# Altium footprint library 20210518.PcbLib: 414 footprints (part 23 of 26)
Each footprint in its own frame and in the unit in brackets; x right, y up, seen from the top. Pads: shape width x height; smd on the part's side, far side on the other; paste and mask are expansions set on the pad; w line width, h text height; cw(c..) or ccw(c..) is an arc to the next point about the centre after c.
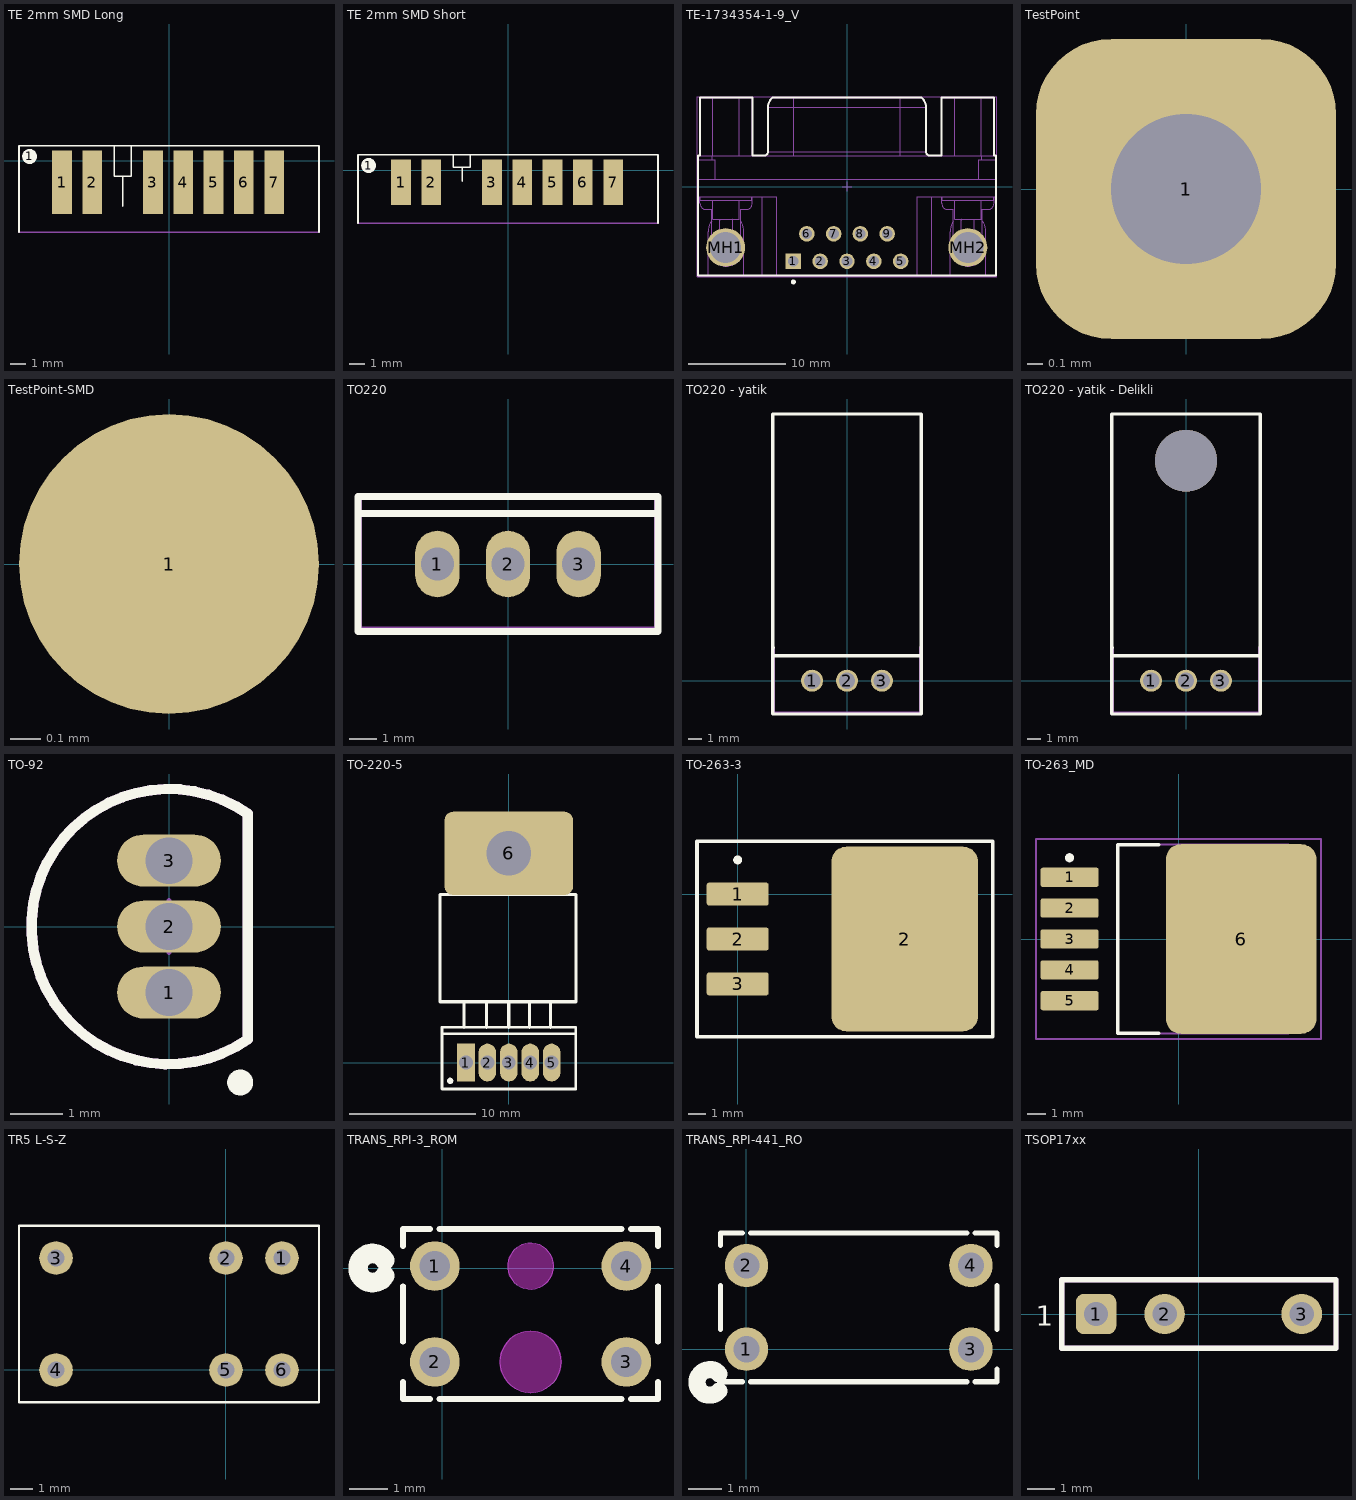
[diagram p22: the footprints below, top view; thin cyan lines are the x and y axes]

## TE 2mm SMD Long [mm] "2mm pitch Battery Rec. Assy. 7Pos. H=4.0"
pads (8):
  round 1 on Top Overlay: 1(-9.2,0.3)
  rect 1.3x4.2 smd: 1(-7.06,-1.4) 2(-5.06,-1.4) 3(-1.06,-1.4) 4(0.94,-1.4) 5(2.94,-1.4) 6(4.94,-1.4) 7(6.94,-1.4)
Top Overlay:
  lines w0.1: -9.9,-4.7 -9.9,1 9.9,1 9.9,-4.7 ; -3.6,1 -3.6,-1 -2.5,-1 -2.5,1 ; -3.06,-3 -3.06,-1
Mechanical 15:
  lines w0.1: -9.9,-4.7 9.9,-4.7
3D body: height 3.3, standoff -0.7, extent -9.4,-10.71 9.4,-0.01

## TE 2mm SMD Short [mm] "2mm pitch Battery Rec. Assy. 7Pos. H=4.0"
pads (8):
  round 1 on Top Overlay: 1(-9.2,0.3)
  rect 1.3x3 smd: 1(-7.06,-0.8) 2(-5.06,-0.8) 3(-1.06,-0.8) 4(0.94,-0.8) 5(2.94,-0.8) 6(4.94,-0.8) 7(6.94,-0.8)
Top Overlay:
  lines w0.1: -9.9,-3.5 -9.9,1 9.9,1 9.9,-3.5 ; -3.6,1 -3.6,0.18 -2.5,0.18 -2.5,1 ; -3.02,-0.73 -3.02,0.18
Mechanical 15:
  lines w0.1: -9.9,-3.5 9.9,-3.5
3D body: height 3.2, standoff -0.8, extent -9.5,-9.1 9.3,0.2

## TE-1734354-1-9_V [mm] "TH, 9-Leads, Body 30.8x18.4mm, Pitch 2.77mm"
height 12.75
pads (11):
  rect 1.6x1.6 hole 1.09: 1(-5.54,-7.72)
  round 1.6 hole 1.09: 2(-2.77,-7.72) 3(0,-7.72) 4(2.77,-7.72) 5(5.54,-7.72) 6(-4.155,-4.88) 7(-1.385,-4.88) 8(1.385,-4.88) 9(4.155,-4.88)
  round 4 hole 3.2: MH1(-12.545,-6.3) MH2(12.495,-6.3)
Top Overlay:
  circle w0.25: c-5.54,-9.85 r0.125
  lines w0.2: -15.4,-9.2 15.4,-9.2 15.4,3.2 15.209,3.2 15.209,9.2 9.781,9.2 9.781,3.2 8.565,3.2 cw(c8.565,3.6) 8.165,3.6 8.165,8.2 ccw(c6.895,8.2) 7.678,9.2 -7.678,9.2 ccw(c-6.895,8.2) -8.165,8.2 -8.165,3.6 cw(c-8.565,3.6) -8.565,3.2 -9.781,3.2 -9.781,9.2 -15.209,9.2 -15.209,3.2 -15.4,3.2 -15.4,-9.2
Mechanical 13:
  lines w0.1: -15.4,-1.05 -7.25,-1.05 -7.25,-9.2 ; -15.4,0.75 15.4,0.75 ; -15.4,2.77 -13.9,2.77 ; -15.209,3.2 -15.209,9.2 -9.781,9.2 -9.781,3.2 ; -15.195,-1.05 -15.195,-1.75 ccw(c-14.595,-1.75) -14.595,-2.35 -13.995,-2.35 -13.995,-5.495 ; -15.145,-1.05 -15.145,-1.4 -9.845,-1.4 -9.845,-1.05 ; -14.345,-9.2 -14.345,-4.65 cw(c-12.495,-4.65) -13.995,-3.567 ; -14.345,-6.38 ccw(c-12.495,-6.38) -10.645,-6.38 ; -14.345,-5.995 -14.104,-5.995 ; -14.331,-6.605 -14.104,-6.605 ; -13.995,-5.995 -14.104,-5.995 ; -13.9,3.2 -13.9,2.77 ; -13.855,-1.4 -13.855,-3.4 -11.135,-3.4 -11.135,-1.4 ; -13.852,3.2 -13.852,9.2 ; -13.6,0.75 -13.6,2.77 -13.9,2.77 ; -13.157,-3.4 ccw(c-12.495,-3.465) -13.16,-3.465 -13.16,-5.495 ; -11.833,-3.4 cw(c-12.495,-3.465) -11.83,-3.465 -11.83,-5.495 ; -11.138,3.2 -11.138,9.2 ; -10.995,-5.995 -10.886,-5.995 ; -10.995,-3.567 cw(c-12.495,-4.65) -10.645,-4.65 -10.645,-9.2 ; -10.659,-6.605 -10.886,-6.605 ; -10.645,-5.995 -10.886,-5.995 ; -9.795,-1.05 -9.795,-1.75 cw(c-10.395,-1.75) -10.395,-2.35 -10.995,-2.35 -10.995,-5.495 ; -8.75,-9.2 -8.75,-1.05 ; -8.565,3.2 ccw(c-8.565,3.6) -8.165,3.6 ; -5.525,3.2 -5.525,3.6 ; -5.525,9.2 -5.525,8.2 ; 5.525,3.2 5.525,3.6 ; 5.525,9.2 5.525,8.2 ; 7.25,-9.2 7.25,-1.05 15.4,-1.05 ; 8.565,3.2 cw(c8.565,3.6) 8.165,3.6 ; 8.75,-9.2 8.75,-1.05 ; 9.781,3.2 9.781,9.2 15.209,9.2 15.209,3.2 ; 9.795,-1.05 9.795,-1.75 ccw(c10.395,-1.75) 10.395,-2.35 10.995,-2.35 10.995,-5.495 ; 9.845,-1.05 9.845,-1.4 15.145,-1.4 15.145,-1.05 ; 10.645,-9.2 10.645,-4.65 cw(c12.495,-4.65) 10.995,-3.567 ; 10.645,-6.38 ccw(c12.495,-6.38) 14.345,-6.38 ; 10.645,-5.995 10.886,-5.995 ; 10.659,-6.605 10.886,-6.605 ; 10.995,-5.995 10.886,-5.995 ; 11.135,-1.4 11.135,-3.4 13.855,-3.4 13.855,-1.4 ; 11.138,3.2 11.138,9.2 ; 11.833,-3.4 ccw(c12.495,-3.465) 11.83,-3.465 11.83,-5.495 ; 13.157,-3.4 cw(c12.495,-3.465) 13.16,-3.465 13.16,-5.495 ; 13.6,0.75 13.6,2.77 13.9,2.77 ; 13.852,3.2 13.852,9.2 ; 13.9,3.2 13.9,2.77 ; 13.995,-5.995 14.104,-5.995 ; 13.995,-3.567 cw(c12.495,-4.65) 14.345,-4.65 14.345,-9.2 ; 14.331,-6.605 14.104,-6.605 ; 14.345,-5.995 14.104,-5.995 ; 15.195,-1.05 15.195,-1.75 cw(c14.595,-1.75) 14.595,-2.35 13.995,-2.35 13.995,-5.495 ; 15.4,2.77 13.9,2.77 ; -14.104,-6.605 -13.995,-6.605 ; -14.104,-6.605 -14.104,-5.995 ; -13.995,-6.605 -13.16,-6.605 -13.16,-5.495 ; -13.995,-6.605 -13.995,-5.495 ; -13.995,-5.495 -13.16,-5.495 ; -11.83,-5.495 -10.995,-5.495 ; -11.83,-5.495 -11.83,-6.605 -10.995,-6.605 ; -10.995,-6.605 -10.995,-5.495 ; -10.995,-6.605 -10.886,-6.605 ; -10.886,-6.605 -10.886,-5.995 ; -8.165,3.6 -5.525,3.6 ; -8.165,3.6 -8.165,8.2 ; -8.165,8.2 cw(c-6.895,8.2) -7.678,9.2 7.678,9.2 cw(c6.895,8.2) 8.165,8.2 ; -8.165,8.2 -5.525,8.2 ; -5.525,3.6 -5.525,8.2 ; -5.525,3.6 5.525,3.6 ; -5.525,8.2 5.525,8.2 ; 5.525,3.6 5.525,8.2 ; 5.525,3.6 8.165,3.6 ; 5.525,8.2 8.165,8.2 ; 8.165,3.6 8.165,8.2 ; 10.886,-6.605 10.995,-6.605 ; 10.886,-6.605 10.886,-5.995 ; 10.995,-6.605 11.83,-6.605 11.83,-5.495 ; 10.995,-6.605 10.995,-5.495 ; 10.995,-5.495 11.83,-5.495 ; 13.16,-5.495 13.16,-6.605 13.995,-6.605 ; 13.16,-5.495 13.995,-5.495 ; 13.995,-6.605 14.104,-6.605 ; 13.995,-6.605 13.995,-5.495 ; 14.104,-6.605 14.104,-5.995 ; -15.4,-9.2 15.4,-9.2 15.4,3.2 -15.4,3.2 -15.4,-9.2
Mechanical 15:
  lines w0.05: -15.5,-9.3 15.5,-9.3 15.5,9.3 -15.5,9.3 -15.5,-9.3
  lines w0.1: -0.5,0 0.5,0 ; 0,-0.5 0,0.5
3D body: height 12.5, standoff -4.1, extent -15.4,-9.2 15.4,9.22

## TestPoint [mm] "Custom Test Point"
pads (1):
  rrect50% 2x2 hole 1: 1(0,0)

## TestPoint-SMD [mm] "Custom Test Point"
pads (1):
  round 1 smd: 1(0,0)

## TO220 [mm]
pads (3):
  oval 1.6x2.4 hole 1.2: 1(-2.54,0) 2(0,0) 3(2.54,0)
Top Overlay:
  lines w0.254: -5.375,1.825 5.375,1.825 ; -5.375,2.4 -5.35,2.4 ; -5.4,-2.425 5.4,-2.425 5.4,2.425 -5.4,2.425 -5.4,-2.425
Mechanical 15:
  lines w0.254: -5.375,2.425 -5.375,-2.375 5.375,-2.375 5.375,2.4
3D body: height 20.8, standoff -7.98, extent -5.05,-2.2 4.85,2.3

## TO220 - yatik [mm]
pads (3):
  round 1.6 hole 1.2: 1(-2.54,0) 2(0,0) 3(2.54,0)
Top Overlay:
  lines w0.254: -5.375,1.825 5.375,1.825 ; -5.375,2.4 -5.35,2.4 ; -5.4,-2.425 -5.4,19.4 5.4,19.4 5.4,-2.425 -5.4,-2.425
Mechanical 15:
  lines w0.254: -5.375,2.425 -5.375,-2.375 5.375,-2.375 5.375,2.4
3D body: height 4.45, standoff -1.79, extent -4.96,-0.14 5.2,19.14

## TO220 - yatik - Delikli [mm]
pads (3):
  round 1.6 hole 1.2: 1(-2.54,0) 2(0,0) 3(2.54,0)
via 0,16 diameter 4.5 hole 4.5
Top Overlay:
  lines w0.254: -5.375,1.825 5.375,1.825 ; -5.375,2.4 -5.35,2.4 ; -5.4,-2.425 5.4,-2.425 5.4,19.4 -5.4,19.4 -5.4,-2.425
Mechanical 15:
  lines w0.254: -5.375,2.425 -5.375,-2.375 5.375,-2.375 5.375,2.4
3D body: height 4.45, standoff -1.79, extent -4.96,-0.14 5.2,19.14

## TO-92 [mm] "TO-92; 3 In-Line, Axial Leads; Body Dia. 4.8mm; Leads 0.55 x 0.51 mm (max)"
height 5.33
pads (3):
  oval 2x1 hole 0.9: 1(0,-1.27) 2(0,0) 3(0,1.27)
Top Overlay:
  circle w0.25: c1.371,-3.003 r0.125
  lines w0.2: 1.52,-2.171 cw(c0,0) 1.52,2.171 1.52,-2.171
Mechanical 13:
  lines w0.2: 1.52,-2.171 cw(c0,0) 1.52,2.171 1.52,-2.171
Mechanical 15:
  lines w0.1: -0.5,0 0.5,0 ; 0,-0.5 0,0.5
3D body: height 10.55, standoff -3.65, extent -2.3,-2.4 1.7,2.4

## TO-220-5 [mm] "TO220-5, Thru-Hole, Horizontal, PCB HeatSink; 5 In-Line Leads; Pitch 1.70 mm"
height 5.6
pads (6):
  rect 1.4x3 hole 1.1: 1(-3.4,0)
  oval 1.4x3 hole 1.1: 2(-1.7,0) 3(0,0) 4(1.7,0) 5(3.4,0)
  rrect20% 10.2x6.6 hole 3.5: 6(0,16.6)
Top Overlay:
  circle w0.25: c-4.65,-1.45 r0.125
  lines w0.2: -5.3,2.3 5.3,2.3 ; -5.3,-2.1 -5.3,2.8 5.3,2.8 5.3,-2.1 -5.3,-2.1
  lines w0.254: -3.556,2.794 -3.556,4.826 ; -1.778,2.794 -1.778,4.826 ; 0,2.794 0,4.826 ; 1.651,2.794 1.651,4.826 ; 3.302,2.794 3.302,4.826 ; -5.461,4.826 5.334,4.826 5.334,13.335 -5.461,13.335 -5.461,4.826
Mechanical 13:
  lines w0.1: -5.3,2.3 5.3,2.3 ; -5.3,-2.1 5.3,-2.1 5.3,2.8 -5.3,2.8 -5.3,-2.1 ; -3.91,-0.28 -2.89,-0.28 -2.89,0.28 -3.91,0.28 -3.91,-0.28 ; -2.21,-0.28 -1.19,-0.28 -1.19,0.28 -2.21,0.28 -2.21,-0.28 ; -0.51,-0.28 0.51,-0.28 0.51,0.28 -0.51,0.28 -0.51,-0.28 ; 1.19,-0.28 2.21,-0.28 2.21,0.28 1.19,0.28 1.19,-0.28 ; 2.89,-0.28 3.91,-0.28 3.91,0.28 2.89,0.28 2.89,-0.28
Mechanical 15:
  lines w0.1: -0.5,0 0.5,0 ; 0,-0.5 0,0.5
3D body: height 4.56, standoff -5.94, extent -5.081,-0.3 5.081,19.868

## TO-263-3 [mm] "10.16 mm × 9.01 mm"
height 4.83
pads (4):
  rrect20% 3.5x1.3 smd: 1(0,0) 2(0,-2.54) 3(0,-5.08)
  rrect20% 8.3x10.45 smd: 2(9.45,-2.54)
Top Overlay:
  circle w0.25: c0,1.935 r0.125
  lines w0.2: -2.3,-8.08 14.43,-8.08 14.43,3 -2.3,3 -2.3,-8.08
Mechanical 15:
  lines w0.1: 5.5,-2.54 6.5,-2.54 ; 6,-3.04 6,-2.04
3D body: height 4.88, standoff 0.08, extent -1.675,-7.54 13.995,2.46

## TO-263_MD [mm] "D2-PAK, 6-Leads, Body 8.6x10.2mm, Pitch 1.7mm, Lead Span 14.1mm, IPC Medium Density"
height 4.65
pads (6):
  rrect20% 3.2x1.05 smd: 1(-6,3.4) 2(-6,1.7) 3(-6,0) 4(-6,-1.7) 5(-6,-3.4)
  rrect20% 8.3x10.45 smd: 6(3.45,0)
Top Overlay:
  circle w0.25: c-6,4.475 r0.125
  lines w0.2: -1.1,-5.2 -3.35,-5.2 -3.35,5.2 -1.1,5.2
Mechanical 13:
  lines w0.1: -3.35,-5.2 6.05,-5.2 6.05,5.2 -3.35,5.2 -3.35,-5.2
Mechanical 15:
  lines w0.1: -0.5,0 0.5,0 ; 0,-0.5 0,0.5 ; -7.85,-5.5 7.85,-5.5 7.85,5.5 -7.85,5.5 -7.85,-5.5
3D body: height 4.56, standoff 0, extent -6.902,-5.08 7.113,5.08

## TR5 L-S-Z [mil] "Relay"
pads (6):
  round 60 hole 30: 1(100,200) 2(0,200) 3(-303.54,200) 4(-303.54,0) 5(0,0) 6(100,0)
Top Overlay:
  lines w3.94: -369.69,-57.48 166.14,-57.48 166.14,257.48 -369.69,257.48 -369.69,-57.48

## TRANS_RPI-3_ROM [mil]
pads (4):
  round 51 hole 31 mask-1000: 1(-7.87,1.97) 2(-7.87,-96.46) 3(188.98,-96.46) 4(188.98,1.97)
Top Overlay:
  lines w6: -40.45,-117.17 -40.45,-134.74 -12.78,-134.74 ; -40.45,-75.75 -40.45,-18.74 ; -40.45,22.68 -40.45,40.26 -12.78,40.26 ; -2.97,-134.74 184.07,-134.74 ; -2.97,40.26 184.07,40.26 ; 193.88,-134.74 221.55,-134.74 221.55,-117.17 ; 193.88,40.26 221.55,40.26 221.55,22.68 ; 221.55,-75.75 221.55,-18.74
  lines w20: -59.17,-8.01 cw(c-71.85,0) -59.17,8.01
Bottom Overlay:
  circle w20: c-71.85,0 r15
Top Solder:
  region: 188.98,-122.46 198.93,-120.48 207.36,-114.84 213,-106.41 214.98,-96.46 213,-86.51 207.36,-78.07 198.93,-72.44 188.98,-70.46 179.03,-72.44 170.59,-78.07 164.96,-86.51 162.98,-96.46 164.96,-106.41 170.59,-114.84 179.03,-120.48
  region: 188.98,-24.03 198.93,-22.05 207.36,-16.42 213,-7.98 214.98,1.97 213,11.92 207.36,20.35 198.93,25.99 188.98,27.97 179.03,25.99 170.59,20.35 164.96,11.92 162.98,1.97 164.96,-7.98 170.59,-16.42 179.03,-22.05
  region: -7.87,-122.46 2.08,-120.48 10.51,-114.84 16.15,-106.41 18.13,-96.46 16.15,-86.51 10.51,-78.07 2.08,-72.44 -7.87,-70.46 -17.82,-72.44 -26.26,-78.07 -31.89,-86.51 -33.87,-96.46 -31.89,-106.41 -26.26,-114.84 -17.82,-120.48
  region: -7.87,-24.03 2.08,-22.05 10.51,-16.42 16.15,-7.98 18.13,1.97 16.15,11.92 10.51,20.35 2.08,25.99 -7.87,27.97 -17.82,25.99 -26.26,20.35 -31.89,11.92 -33.87,1.97 -31.89,-7.98 -26.26,-16.42 -17.82,-22.05
Bottom Solder:
  region: 188.98,-122.46 198.93,-120.48 207.36,-114.84 213,-106.41 214.98,-96.46 213,-86.51 207.36,-78.07 198.93,-72.44 188.98,-70.46 179.03,-72.44 170.59,-78.07 164.96,-86.51 162.98,-96.46 164.96,-106.41 170.59,-114.84 179.03,-120.48
  region: 188.98,-24.03 198.93,-22.05 207.36,-16.42 213,-7.98 214.98,1.97 213,11.92 207.36,20.35 198.93,25.99 188.98,27.97 179.03,25.99 170.59,20.35 164.96,11.92 162.98,1.97 164.96,-7.98 170.59,-16.42 179.03,-22.05
  region: -7.87,-122.46 2.08,-120.48 10.51,-114.84 16.15,-106.41 18.13,-96.46 16.15,-86.51 10.51,-78.07 2.08,-72.44 -7.87,-70.46 -17.82,-72.44 -26.26,-78.07 -31.89,-86.51 -33.87,-96.46 -31.89,-106.41 -26.26,-114.84 -17.82,-120.48
  region: -7.87,-24.03 2.08,-22.05 10.51,-16.42 16.15,-7.98 18.13,1.97 16.15,11.92 10.51,20.35 2.08,25.99 -7.87,27.97 -17.82,25.99 -26.26,20.35 -31.89,11.92 -33.87,1.97 -31.89,-7.98 -26.26,-16.42 -17.82,-22.05
Keep-Out Layer:
  board cut-out: 118.06,-112.34 119.1,-110.53 121.49,-104.75 122.59,-96.46 121.49,-88.17 118.29,-80.44 113.2,-73.8 106.57,-68.71 98.84,-65.51 90.55,-64.42 82.26,-65.51 74.53,-68.71 67.9,-73.8 62.81,-80.44 59.61,-88.17 58.79,-94.37 58.79,-96.46 58.79,-98.54 59.61,-104.75 62.81,-112.47 67.9,-119.11 74.53,-124.2 82.26,-127.4 90.55,-128.49 98.84,-127.4 106.57,-124.2 115.97,-115.96
  board cut-out: 114.17,1.97 114.17,4.3 112.8,11.19 107.58,19 99.77,24.22 92.88,25.59 90.55,25.59 88.22,25.59 81.33,24.22 73.52,19 68.3,11.19 66.93,4.3 66.93,1.97 66.93,-0.36 68.3,-7.25 73.52,-15.06 81.33,-20.28 88.22,-21.65 90.55,-21.65 92.88,-21.65 99.77,-20.28 107.58,-15.06 112.8,-7.25 114.17,-0.36
Outline:
  circle w0.5: c90.55,1.97 r23.62
  lines w0.5: 117.83,-112.2 ccw(c90.55,-96.46) 117.83,-112.2
3D body: height 212.6, standoff -78.74, extent -36.42,-129.92 217.52,35.43

## TRANS_RPI-441_RO [mil]
pads (4):
  round 51 hole 31 mask-1000: 1(0,0) 2(0,98.43) 3(263.78,0) 4(263.78,98.43)
Top Overlay:
  lines w6: -30.61,-23.52 -30.61,-38.29 -4.9,-38.29 ; -30.61,23.52 -30.61,74.91 ; -30.61,121.94 -30.61,136.71 -4.9,136.71 ; 4.9,-38.29 258.88,-38.29 ; 4.9,136.71 258.88,136.71 ; 268.68,-38.29 294.39,-38.29 294.39,-23.52 ; 268.68,136.71 294.39,136.71 294.39,121.94 ; 294.39,23.52 294.39,74.91
  lines w20: -32,-49 cw(c-43.13,-38.95) -32,-28.89
Bottom Overlay:
  circle w20: c-43.13,-38.95 r15
Top Solder:
  region: 263.78,124.42 253.83,122.45 245.4,116.81 239.76,108.37 237.78,98.43 239.76,88.48 245.4,80.04 253.83,74.4 263.78,72.43 273.73,74.4 282.16,80.04 287.8,88.48 289.78,98.43 287.8,108.37 282.16,116.81 273.73,122.45
  region: 263.78,26 253.83,24.02 245.4,18.38 239.76,9.95 237.78,0 239.76,-9.95 245.4,-18.38 253.83,-24.02 263.78,-26 273.73,-24.02 282.16,-18.38 287.8,-9.95 289.78,0 287.8,9.95 282.16,18.38 273.73,24.02
  region: 0,124.42 -9.95,122.45 -18.38,116.81 -24.02,108.37 -26,98.43 -24.02,88.48 -18.38,80.04 -9.95,74.4 0,72.43 9.95,74.4 18.38,80.04 24.02,88.48 26,98.43 24.02,108.37 18.38,116.81 9.95,122.45
  region: 0,26 -9.95,24.02 -18.38,18.38 -24.02,9.95 -26,0 -24.02,-9.95 -18.38,-18.38 -9.95,-24.02 0,-26 9.95,-24.02 18.38,-18.38 24.02,-9.95 26,0 24.02,9.95 18.38,18.38 9.95,24.02
Bottom Solder:
  region: 263.78,124.42 253.83,122.45 245.4,116.81 239.76,108.37 237.78,98.43 239.76,88.48 245.4,80.04 253.83,74.4 263.78,72.43 273.73,74.4 282.16,80.04 287.8,88.48 289.78,98.43 287.8,108.37 282.16,116.81 273.73,122.45
  region: 263.78,26 253.83,24.02 245.4,18.38 239.76,9.95 237.78,0 239.76,-9.95 245.4,-18.38 253.83,-24.02 263.78,-26 273.73,-24.02 282.16,-18.38 287.8,-9.95 289.78,0 287.8,9.95 282.16,18.38 273.73,24.02
  region: 0,124.42 -9.95,122.45 -18.38,116.81 -24.02,108.37 -26,98.43 -24.02,88.48 -18.38,80.04 -9.95,74.4 0,72.43 9.95,74.4 18.38,80.04 24.02,88.48 26,98.43 24.02,108.37 18.38,116.81 9.95,122.45
  region: 0,26 -9.95,24.02 -18.38,18.38 -24.02,9.95 -26,0 -24.02,-9.95 -18.38,-18.38 -9.95,-24.02 0,-26 9.95,-24.02 18.38,-18.38 24.02,-9.95 26,0 24.02,9.95 18.38,18.38 9.95,24.02
3D body: height 208.66, standoff -137.8, extent -26.48,-33.68 288.48,131.68

## TSOP17xx [mm] "TSOP17xx IR Reciever Footprint"
height 8.5
pads (3):
  rrect40% 1.5x1.5 hole 0.9: 1(-3.81,0)
  round 1.5 hole 0.9: 2(-1.27,0) 3(3.81,0)
Top Overlay:
  lines w0.2: -5.085,-1.275 5.08,-1.275 5.08,1.275 -5.085,1.275 -5.085,-1.275
  text "1" at -6.035,-0.7 h1.27
Mechanical 13:
  lines w0.2: -5.085,-1.275 -5.085,1.275 5.08,1.275 5.08,-1.275 -5.085,-1.275
Mechanical 15:
  lines w0.2: -5.085,-1.275 5.08,-1.275 5.08,1.275 -5.085,1.275 -5.085,-1.275
3D body: height 6.75, standoff -4.88, extent -5,-0.3 5,17.2